# Altium footprint library Core429IBaseBoardVerE.PcbLib: 35 footprints (part 1 of 3)
Each footprint in its own frame and in the unit in brackets; x right, y up, seen from the top. Pads: shape width x height; smd on the part's side, far side on the other; paste and mask are expansions set on the pad; w line width, h text height; cw(c..) or ccw(c..) is an arc to the next point about the centre after c.
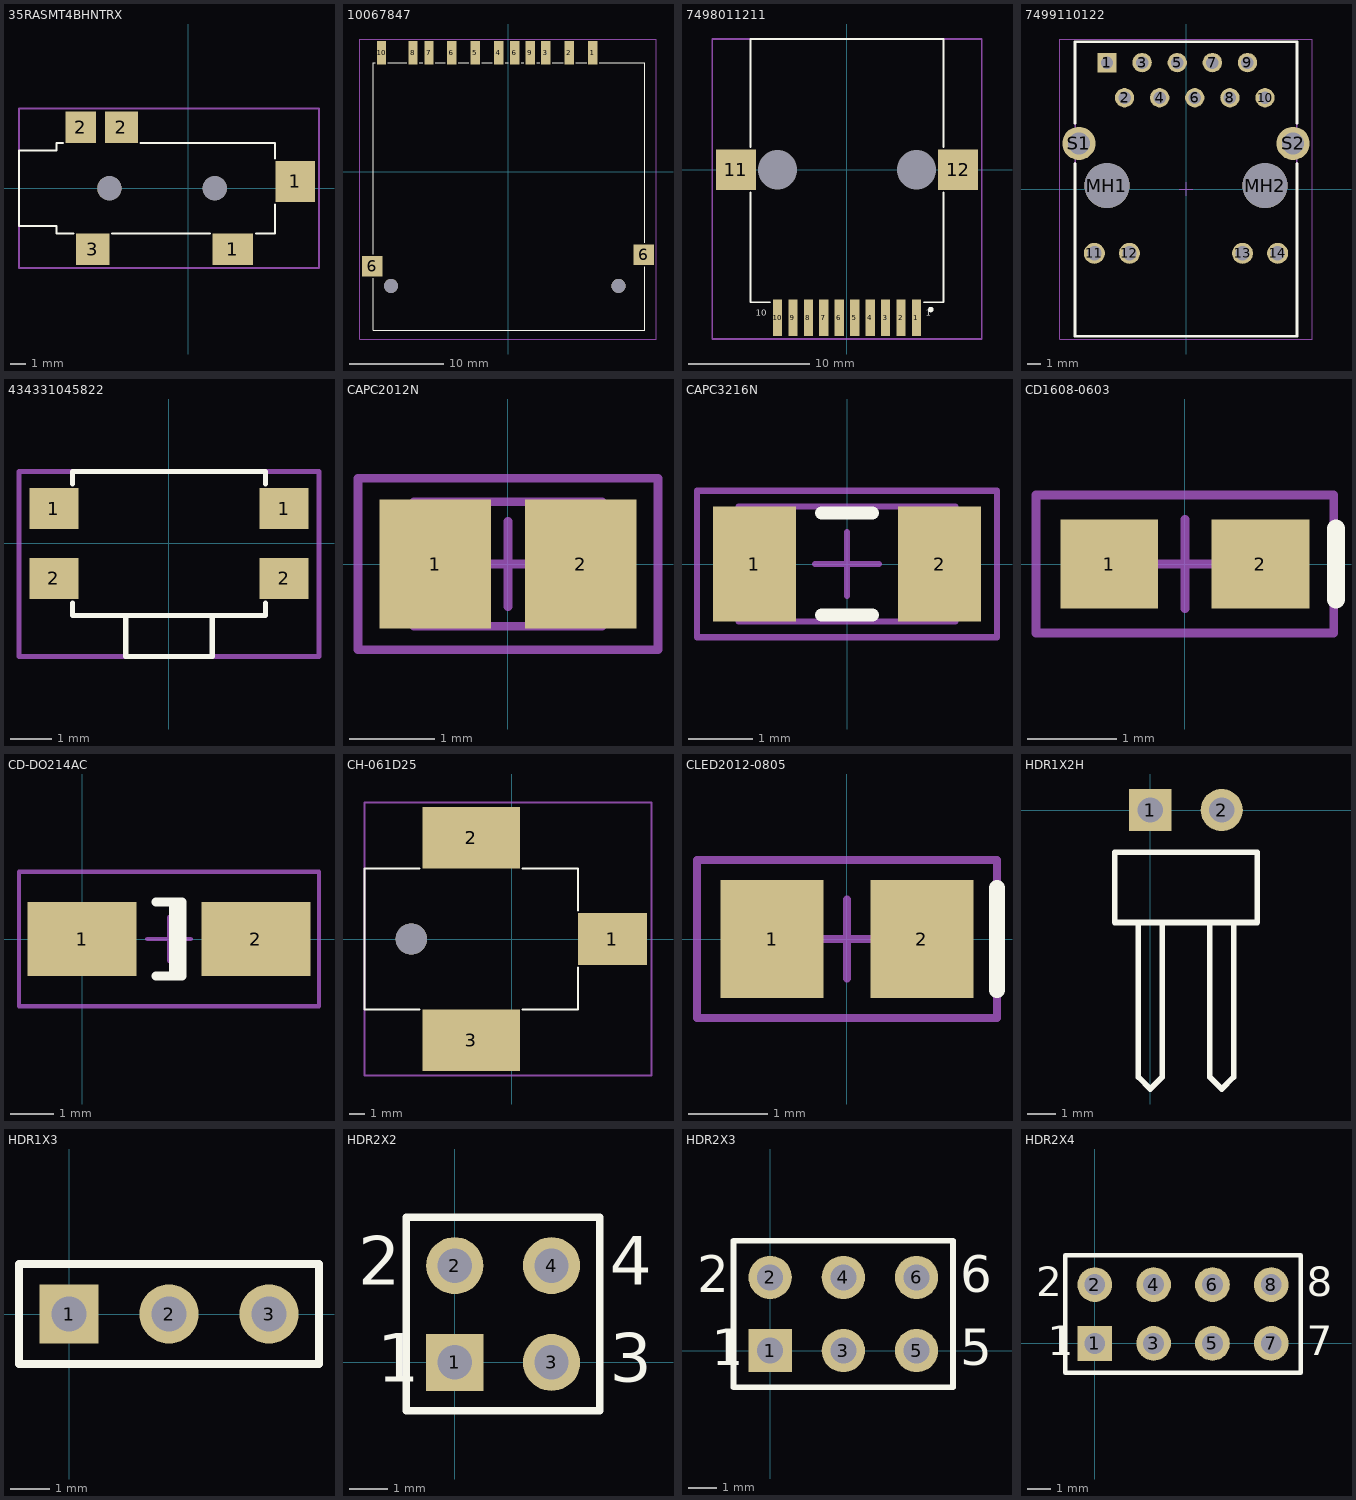
[diagram p0: the footprints below, top view; thin cyan lines are the x and y axes]

## 35RASMT4BHNTRX [mm] "3.5mm Phone Jack Surface Mount, RoHS"
height 5
pads (7):
  rect 2.7x2.1 smd: 1(2.975,-4.05)
  rect 2.6x2.7 smd: 1(7.125,0.45)
  rect 2x2.1 smd: 2(-7.125,4.05)
  rect 2.2x2.1 smd: 2(-4.425,4.05) 3(-6.325,-4.05)
  round 1.6 hole 1.6: ""(-5.225,0) ""(1.775,0)
Top Overlay:
  lines w0.127: -8.3,3 -8.725,3 ; -7.6,-3 -8.725,-3 -8.725,-2.5 -11.225,-2.5 -11.225,2.5 -8.725,2.5 -8.725,3 ; -5.05,-3 1.45,-3 ; -3.15,3 5.775,3 5.775,1.975 ; 4.5,-3 5.775,-3 5.775,-1.075 ; -8.725,3 -8.725,3
Mechanical 15:
  lines w0.127: -11.225,-5.3 -11.225,5.3 8.7,5.3 8.7,-5.3 -11.225,-5.3
3D body "35RASMT4BHNTRX.STEP": height 5.07, standoff -0.93, extent -11.219,-4.496 7.78,4.496

## 10067847 [mm] "SD Card Reader"
height 2.8
pads (15):
  rect 1x2.5 smd: 1(9.025,12.65) 2(6.525,12.65) 3(4.025,12.65) 4(-0.975,12.65) 5(-3.475,12.65) 6(-5.975,12.65) 6(0.725,12.65) 7(-8.4,12.65) 8(-10.1,12.65) 9(2.375,12.65) 10(-13.45,12.65)
  rect 2.2x2.2 smd: 6(-14.45,-10.05) 6(14.45,-8.85)
  round 1.5 hole 1.5: ""(-12.45,-12.15) ""(11.75,-12.15)
Top Overlay:
  lines w0.127: -14.35,-11.325 -14.35,-16.85 14.55,-16.85 14.55,-10.125 ; -14.35,-8.775 -14.35,11.55 -14.125,11.55 ; -12.775,11.55 -10.775,11.55 ; -9.425,11.55 -9.075,11.55 ; -7.725,11.55 -6.65,11.55 ; -5.3,11.55 -4.15,11.55 ; -2.8,11.55 -1.65,11.55 ; -0.3,11.55 0.05,11.55 ; 1.4,11.55 1.7,11.55 ; 3.05,11.55 3.35,11.55 ; 4.7,11.55 5.85,11.55 ; 7.2,11.55 8.35,11.55 ; 9.7,11.55 14.55,11.55 14.55,-7.575
Mechanical 15:
  lines w0.127: -15.775,-17.8 15.775,-17.8 15.775,14.1 -15.775,14.1 -15.775,-17.8
3D body "10067847011rlf.stp": height 2.92, standoff 0.02, extent -14.25,-17.8 14.2,12.45

## 7498011211 [mm] "RJ45 LAN Transformer, 10/100/1000 Base-T SMD"
height 13.5
pads (14):
  rect 0.76x3.03 smd: 1(5.715,-12.18) 2(4.445,-12.18) 3(3.175,-12.18) 4(1.905,-12.18) 5(0.635,-12.18) 6(-0.635,-12.18) 7(-1.905,-12.18) 8(-3.175,-12.18) 9(-4.445,-12.18) 10(-5.715,-12.18)
  rect 3.3x3.3 smd: 11(-9.145,0) 12(9.145,0)
  round 0 hole 3.22 unplated: ""(-5.715,0) ""(5.715,0)
Top Overlay:
  circle w0.254: c6.9,-11.5 r0.1
  lines w0.127: -7.94,-1.85 -7.94,-10.89 -6.3,-10.89 ; -7.94,1.85 -7.94,10.76 7.94,10.76 7.94,1.85 ; 6.3,-10.89 7.94,-10.89 7.94,-1.85
  text "10" at -7.5,-12 h0.5
  text "1" at 6.5,-12 h0.5
Mechanical 15:
  lines w0.127: -11.07,-13.925 -11.07,10.76 11.07,10.76 11.07,-13.925 -11.07,-13.925
3D body "7498011211.stp": height 14.82, standoff -2.7, extent -10.25,-12.425 10.25,10.725

## 7499110122 [mm] "LAN Transformer, body 21.3x16.04mm"
height 13.5
pads (18):
  rect 1.4x1.4 hole 0.9: 1(-5.715,9.14)
  round 1.4 hole 0.9: 2(-4.445,6.6) 3(-3.175,9.14) 4(-1.905,6.6) 5(-0.635,9.14) 6(0.635,6.6) 7(1.905,9.14) 8(3.175,6.6) 9(4.445,9.14) 10(5.715,6.6)
  round 1.52 hole 1.02: 11(-6.63,-4.65) 12(-4.09,-4.65) 13(4.09,-4.65) 14(6.63,-4.65)
  round 3.25 hole 3.25 unplated: MH1(-5.715,0.25) MH2(5.715,0.25)
  round 2.4 hole 1.6: S1(-7.745,3.3) S2(7.745,3.3)
Top Overlay:
  lines w0.2: -8.02,1.85 -8.02,-10.65 8.02,-10.65 8.02,1.85 ; -8.02,4.75 -8.02,10.65 8.02,10.65 8.02,4.75
Mechanical 13:
  lines w0.1: -8.02,-10.65 -8.02,10.65 8.02,10.65 8.02,-10.65 -8.02,-10.65
Mechanical 15:
  lines w0.05: -0.5,0 0.5,0 ; 0,-0.5 0,0.5 ; -9.145,-10.85 -9.145,10.85 9.145,10.85 9.145,-10.85 -9.145,-10.85
3D body "7499110122.stp": height 13.7, standoff -3.65, extent -8.22,-10.65 8.22,10.65

## 434331045822 [mm] "4.7*3.5mm side push type,SMD, height 1.65mm, black actuator, 220gf, T&R"
height 1.65
pads (4):
  rect 1.2x1 smd: 1(-2.8,0.85) 1(2.8,0.85) 2(-2.8,-0.85) 2(2.8,-0.85)
Top Overlay:
  lines w0.127: -2.35,1.45 -2.35,1.75 2.35,1.75 2.35,1.45 ; 2.35,-1.45 2.35,-1.75 1.05,-1.75 ; -2.35,-1.45 -2.35,-1.45 ; -2.35,-1.45 -2.35,-1.75 1.05,-1.75 ; 1.05,-1.75 1.05,-2.75 -1.05,-2.75 -1.05,-1.75 1.05,-1.75
Mechanical 15:
  lines w0.127: -3.65,-2.75 3.65,-2.75 3.65,1.75 -3.65,1.75 -3.65,-2.75
3D body "4343x10458xx.stp": height 1.65, standoff 0, extent -3.2,-2.75 3.2,1.75

## CAPC2012N [mm] "Chip Capacitor, Body 2.0x1.3mm, IPC Medium Density"
height 1.1
pads (2):
  rect 1.3x1.5 smd: 1(-0.85,0) 2(0.85,0)
Mechanical 13:
  lines w0.1: -1.1,-0.725 -1.1,0.725 1.1,0.725 1.1,-0.725 -1.1,-0.725
Mechanical 15:
  lines w0.1: -0.5,0 0.5,0 ; 0,-0.5 0,0.5 ; -1.75,-1 -1.75,1 1.75,1 1.75,-1 -1.75,-1
3D body "0805 SMD Capacitor.step": height 0.78, standoff 0, extent -1,-0.625 1,0.625

## CAPC3216N [mm] "Chip Capacitor, Body 3.2x1.6mm, IPC Medium Density"
height 1.35
pads (2):
  rect 1.3x1.8 smd: 1(-1.45,0) 2(1.45,0)
Top Overlay:
  lines w0.2: -0.4,-0.8 0.4,-0.8 ; -0.4,0.8 0.4,0.8
Mechanical 13:
  lines w0.1: -1.7,-0.9 -1.7,0.9 1.7,0.9 1.7,-0.9 -1.7,-0.9
Mechanical 15:
  lines w0.1: -0.5,0 0.5,0 ; 0,-0.5 0,0.5 ; -2.35,-1.15 -2.35,1.15 2.35,1.15 2.35,-1.15 -2.35,-1.15
3D body "1206 SMD Capacitor.step": height 1, standoff 0, extent -1.6,-0.825 1.6,0.775

## CD1608-0603 [mm] "Chip Diode; Body 1.6 x 0.8 mm (LxW typ)"
height 0.85
pads (2):
  rect 1.1x1 smd: 1(-0.85,0) 2(0.85,0)
Top Overlay:
  lines w0.2: 1.7,-0.4 1.7,0.4
Mechanical 15:
  lines w0.1: -0.5,0 0.5,0 ; 0,-0.5 0,0.5 ; -1.675,-0.775 1.675,-0.775 1.675,0.775 -1.675,0.775 -1.675,-0.775
3D body "D0603.step": height 0.58, standoff 0.02, extent -0.85,-0.4 0.85,0.4

## CD-DO214AC [mm] "Chip Diode; Body 5.0 x 2.5 mm (LxW typ)"
height 2.1
pads (2):
  rect 2.5x1.7 smd: 1(0,0) 2(4,0)
Top Overlay:
  lines w0.2: 1.7,-0.85 2.3,-0.85 2.3,0.85 1.7,0.85 ; 2.1,-0.85 2.1,0.85
Mechanical 15:
  lines w0.1: 1.5,0 2.5,0 ; 2,-0.5 2,0.5 ; -1.45,-1.55 5.45,-1.55 5.45,1.55 -1.45,1.55 -1.45,-1.55
3D body "DIOM5528X26.step": height 2.6, standoff 0.03, extent -0.75,-1.4 4.75,1.4

## CH-061D25 [mm] "DC Power Socket"
height 11
pads (4):
  rect 4.4x3.3 smd: 1(6.4,0)
  rect 6.2x3.9 smd: 2(-2.6,6.45) 3(-2.6,-6.45)
  round 2 hole 2: ""(-6.4,0)
Top Overlay:
  lines w0.127: -5.875,-4.5 -9.4,-4.5 -9.4,4.5 -5.875,4.5 ; 0.675,-4.5 4.2,-4.5 4.2,-1.825 ; 0.675,4.5 4.2,4.5 4.2,1.825
Mechanical 15:
  lines w0.127: -9.4,-8.675 8.9,-8.675 8.9,8.675 -9.4,8.675 -9.4,-8.675
3D body "RASM722.STEP": height 11.09, standoff 0.01, extent -9.3,-7.625 7.6,7.575

## CLED2012-0805 [mm] "Chip LED; Body 2.0 x 1.3 mm (LxW typ)"
height 1.1
pads (2):
  rect 1.3x1.5 smd: 1(-0.95,0) 2(0.95,0)
Top Overlay:
  lines w0.2: 1.9,-0.65 1.9,0.65
Mechanical 15:
  lines w0.1: -0.5,0 0.5,0 ; 0,-0.5 0,0.5 ; -1.9,-1 -1.9,1 1.9,1 1.9,-1 -1.9,-1
3D body "LED SMD0805.step": height 0.86, standoff 0.02, extent -1.056,-0.45 1.006,0.456

## HDR1X2H [mm] "Connector; Header; 2 Position; Right Angle"
pads (2):
  rect 1.5x1.5 hole 0.9: 1(0,0)
  round 1.5 hole 0.9: 2(2.54,0)
Top Overlay:
  lines w0.2: -0.423,-4 -0.423,-9.502 0,-9.925 0.423,-9.502 0.423,-4 ; 2.117,-4 2.117,-9.502 2.54,-9.925 2.963,-9.502 2.963,-4 ; -1.27,-4 -1.27,-1.5 3.81,-1.5 3.81,-4 -1.27,-4
3D body "61300211021.stp": height 2.56, standoff -2.98, extent -1.27,-10.04 3.81,0.32

## HDR1X3 [mm] "Connector; Header; 3 Position"
pads (3):
  rect 1.5x1.5 hole 0.9: 1(0,0)
  round 1.5 hole 0.9: 2(2.54,0) 3(5.08,0)
Top Overlay:
  lines w0.2: -1.27,-1.27 6.35,-1.27 6.35,1.27 -1.27,1.27 -1.27,-1.27
3D body "61300311121.stp": height 8.56, standoff -2.98, extent -1.27,-1.27 6.35,1.27

## HDR2X2 [mm] "Connector; Header; 2x2 Position"
pads (4):
  rect 1.5x1.5 hole 0.9: 1(0,0)
  round 1.5 hole 0.9: 2(0,2.54) 3(2.54,0) 4(2.54,2.54)
Top Overlay:
  lines w0.2: -1.27,-1.27 -1.27,3.81 3.81,3.81 3.81,-1.27 -1.27,-1.27
  text "1" at -2.032,-0.508 h1.27
  text "2" at -2.54,2.032 h1.27
  text "4" at 4.064,2.032 h1.27
  text "3" at 4.064,-0.508 h1.27
3D body "61300421121.stp": height 8.56, standoff -2.98, extent -1.27,-1.27 3.81,3.81

## HDR2X3 [mm] "Connector; Header; 3x2 Position"
pads (6):
  rect 1.5x1.5 hole 0.9: 1(0,0)
  round 1.5 hole 0.9: 2(0,2.54) 3(2.54,0) 4(2.54,2.54) 5(5.08,0) 6(5.08,2.54)
Top Overlay:
  lines w0.2: 1.482,-1.27 6.35,-1.27 ; 6.35,-1.27 -1.27,-1.27 -1.27,3.81 6.35,3.81 6.35,-1.27
  text "1" at -2.032,-0.508 h1.27
  text "2" at -2.54,2.032 h1.27
  text "5" at 6.604,-0.508 h1.27
  text "6" at 6.604,2.032 h1.27
3D body "61300621121.stp": height 8.56, standoff -2.98, extent -1.27,-1.27 6.35,3.81

## HDR2X4 [mm] "Connector; Header; 4x2 Position"
pads (8):
  rect 1.5x1.5 hole 0.9: 1(0,0)
  round 1.5 hole 0.9: 2(0,2.54) 3(2.54,0) 4(2.54,2.54) 5(5.08,0) 6(5.08,2.54) 7(7.62,0) 8(7.62,2.54)
Top Overlay:
  lines w0.2: -1.27,-1.27 8.89,-1.27 8.89,3.81 -1.27,3.81 -1.27,-1.27
  text "2" at -2.54,2.032 h1.27
  text "1" at -2.032,-0.508 h1.27
  text "7" at 9.144,-0.508 h1.27
  text "8" at 9.144,2.032 h1.27
3D body "61300821121.stp": height 8.56, standoff -2.98, extent -1.27,-1.27 8.89,3.81